# Altium footprint library smd-ipc.PCBLIB: 363 footprints (part 14 of 27)
Each footprint in its own frame and in the unit in brackets; x right, y up, seen from the top. Pads: shape width x height; smd on the part's side, far side on the other; paste and mask are expansions set on the pad; w line width, h text height; cw(c..) or ccw(c..) is an arc to the next point about the centre after c.
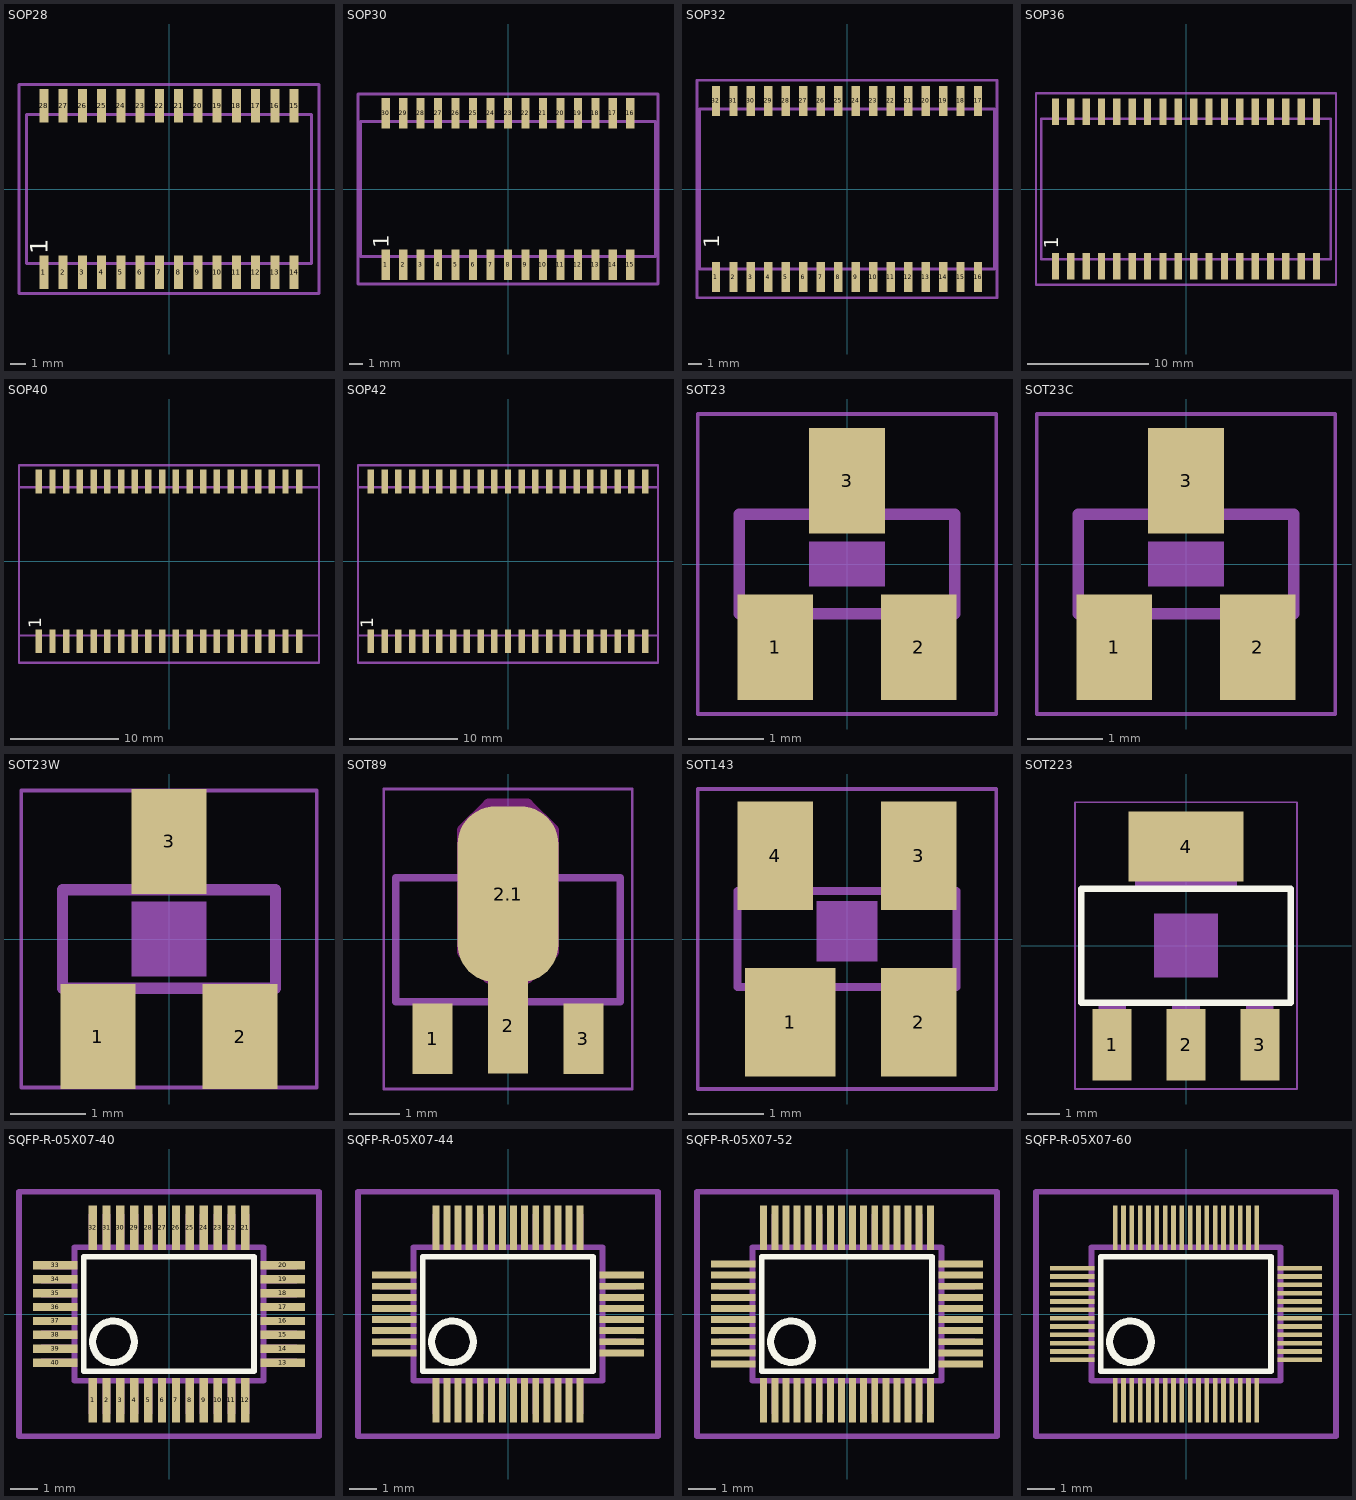
[diagram p13: the footprints below, top view; thin cyan lines are the x and y axes]

## SOP28 [mm]
pads (28):
  rect 0.6x2.2 smd: 1(-8.255,-5.5) 2(-6.985,-5.5) 3(-5.715,-5.5) 4(-4.445,-5.5) 5(-3.175,-5.5) 6(-1.905,-5.5) 7(-0.635,-5.5) 8(0.635,-5.5) 9(1.905,-5.5) 10(3.175,-5.5) 11(4.445,-5.5) 12(5.715,-5.5) 13(6.985,-5.5) 14(8.255,-5.5) 15(8.255,5.5) 16(6.985,5.5) 17(5.715,5.5) 18(4.445,5.5) 19(3.175,5.5) 20(1.905,5.5) 21(0.635,5.5) 22(-0.635,5.5) 23(-1.905,5.5) 24(-3.175,5.5) 25(-4.445,5.5) 26(-5.715,5.5) 27(-6.985,5.5) 28(-8.255,5.5)
Top Overlay:
  text "1" at -7.62,-4.31 h1.97
Mechanical 16:
  rectangle: -8.505,-6.34 -8.005,-5.01
  rectangle: -7.235,-6.34 -6.735,-5.01
  rectangle: -5.965,-6.34 -5.465,-5.01
  rectangle: -4.695,-6.34 -4.195,-5.01
  rectangle: -3.425,-6.34 -2.925,-5.01
  rectangle: -2.155,-6.34 -1.655,-5.01
  rectangle: -0.885,-6.34 -0.385,-5.01
  rectangle: 0.385,-6.34 0.885,-5.01
  rectangle: 1.655,-6.34 2.155,-5.01
  rectangle: 2.925,-6.34 3.425,-5.01
  rectangle: 4.195,-6.34 4.695,-5.01
  rectangle: 5.465,-6.34 5.965,-5.01
  rectangle: 6.735,-6.34 7.235,-5.01
  rectangle: 8.005,-6.34 8.505,-5.01
  rectangle: 8.005,5.01 8.505,6.34
  rectangle: 6.735,5.01 7.235,6.34
  rectangle: 5.465,5.01 5.965,6.34
  rectangle: 4.195,5.01 4.695,6.34
  rectangle: 2.925,5.01 3.425,6.34
  rectangle: 1.655,5.01 2.155,6.34
  rectangle: 0.385,5.01 0.885,6.34
  rectangle: -0.885,5.01 -0.385,6.34
  rectangle: -2.155,5.01 -1.655,6.34
  rectangle: -3.425,5.01 -2.925,6.34
  rectangle: -4.695,5.01 -4.195,6.34
  rectangle: -5.965,5.01 -5.465,6.34
  rectangle: -7.235,5.01 -6.735,6.34
  rectangle: -8.505,5.01 -8.005,6.34
  lines w0.203: -9.415,-4.91 9.415,-4.91 9.415,4.91 -9.415,4.91 -9.415,-4.91
Mechanical 27:
  lines w0.2: -9.9,-6.9 -9.9,6.9 9.9,6.9 9.9,-6.9 -9.9,-6.9

## SOP30 [mm]
pads (30):
  rect 0.6x2.2 smd: 1(-8.89,-5.5) 2(-7.62,-5.5) 3(-6.35,-5.5) 4(-5.08,-5.5) 5(-3.81,-5.5) 6(-2.54,-5.5) 7(-1.27,-5.5) 8(0,-5.5) 9(1.27,-5.5) 10(2.54,-5.5) 11(3.81,-5.5) 12(5.08,-5.5) 13(6.35,-5.5) 14(7.62,-5.5) 15(8.89,-5.5) 16(8.89,5.5) 17(7.62,5.5) 18(6.35,5.5) 19(5.08,5.5) 20(3.81,5.5) 21(2.54,5.5) 22(1.27,5.5) 23(0,5.5) 24(-1.27,5.5) 25(-2.54,5.5) 26(-3.81,5.5) 27(-5.08,5.5) 28(-6.35,5.5) 29(-7.62,5.5) 30(-8.89,5.5)
Top Overlay:
  text "1" at -8.255,-4.31 h1.97
Mechanical 16:
  rectangle: -9.14,-6.34 -8.64,-5.01
  rectangle: -7.87,-6.34 -7.37,-5.01
  rectangle: -6.6,-6.34 -6.1,-5.01
  rectangle: -5.33,-6.34 -4.83,-5.01
  rectangle: -4.06,-6.34 -3.56,-5.01
  rectangle: -2.79,-6.34 -2.29,-5.01
  rectangle: -1.52,-6.34 -1.02,-5.01
  rectangle: -0.25,-6.34 0.25,-5.01
  rectangle: 1.02,-6.34 1.52,-5.01
  rectangle: 2.29,-6.34 2.79,-5.01
  rectangle: 3.56,-6.34 4.06,-5.01
  rectangle: 4.83,-6.34 5.33,-5.01
  rectangle: 6.1,-6.34 6.6,-5.01
  rectangle: 7.37,-6.34 7.87,-5.01
  rectangle: 8.64,-6.34 9.14,-5.01
  rectangle: 8.64,5.01 9.14,6.34
  rectangle: 7.37,5.01 7.87,6.34
  rectangle: 6.1,5.01 6.6,6.34
  rectangle: 4.83,5.01 5.33,6.34
  rectangle: 3.56,5.01 4.06,6.34
  rectangle: 2.29,5.01 2.79,6.34
  rectangle: 1.02,5.01 1.52,6.34
  rectangle: -0.25,5.01 0.25,6.34
  rectangle: -1.52,5.01 -1.02,6.34
  rectangle: -2.79,5.01 -2.29,6.34
  rectangle: -4.06,5.01 -3.56,6.34
  rectangle: -5.33,5.01 -4.83,6.34
  rectangle: -6.6,5.01 -6.1,6.34
  rectangle: -7.87,5.01 -7.37,6.34
  rectangle: -9.14,5.01 -8.64,6.34
  lines w0.203: -10.7,-4.91 10.7,-4.91 10.7,4.91 -10.7,4.91 -10.7,-4.91
Mechanical 27:
  lines w0.2: -10.9,-6.9 -10.9,6.9 10.9,6.9 10.9,-6.9 -10.9,-6.9

## SOP32 [mm]
pads (32):
  rect 0.6x2.2 smd: 1(-9.525,-6.4) 2(-8.255,-6.4) 3(-6.985,-6.4) 4(-5.715,-6.4) 5(-4.445,-6.4) 6(-3.175,-6.4) 7(-1.905,-6.4) 8(-0.635,-6.4) 9(0.635,-6.4) 10(1.905,-6.4) 11(3.175,-6.4) 12(4.445,-6.4) 13(5.715,-6.4) 14(6.985,-6.4) 15(8.255,-6.4) 16(9.525,-6.4) 17(9.525,6.4) 18(8.255,6.4) 19(6.985,6.4) 20(5.715,6.4) 21(4.445,6.4) 22(3.175,6.4) 23(1.905,6.4) 24(0.635,6.4) 25(-0.635,6.4) 26(-1.905,6.4) 27(-3.175,6.4) 28(-4.445,6.4) 29(-5.715,6.4) 30(-6.985,6.4) 31(-8.255,6.4) 32(-9.525,6.4)
Top Overlay:
  text "1" at -8.89,-4.31 h1.97
Mechanical 16:
  rectangle: -9.775,-7.24 -9.275,-5.91
  rectangle: -8.505,-7.24 -8.005,-5.91
  rectangle: -7.235,-7.24 -6.735,-5.91
  rectangle: -5.965,-7.24 -5.465,-5.91
  rectangle: -4.695,-7.24 -4.195,-5.91
  rectangle: -3.425,-7.24 -2.925,-5.91
  rectangle: -2.155,-7.24 -1.655,-5.91
  rectangle: -0.885,-7.24 -0.385,-5.91
  rectangle: 0.385,-7.24 0.885,-5.91
  rectangle: 1.655,-7.24 2.155,-5.91
  rectangle: 2.925,-7.24 3.425,-5.91
  rectangle: 4.195,-7.24 4.695,-5.91
  rectangle: 5.465,-7.24 5.965,-5.91
  rectangle: 6.735,-7.24 7.235,-5.91
  rectangle: 8.005,-7.24 8.505,-5.91
  rectangle: 9.275,-7.24 9.775,-5.91
  rectangle: 9.275,5.91 9.775,7.24
  rectangle: 8.005,5.91 8.505,7.24
  rectangle: 6.735,5.91 7.235,7.24
  rectangle: 5.465,5.91 5.965,7.24
  rectangle: 4.195,5.91 4.695,7.24
  rectangle: 2.925,5.91 3.425,7.24
  rectangle: 1.655,5.91 2.155,7.24
  rectangle: 0.385,5.91 0.885,7.24
  rectangle: -0.885,5.91 -0.385,7.24
  rectangle: -2.155,5.91 -1.655,7.24
  rectangle: -3.425,5.91 -2.925,7.24
  rectangle: -4.695,5.91 -4.195,7.24
  rectangle: -5.965,5.91 -5.465,7.24
  rectangle: -7.235,5.91 -6.735,7.24
  rectangle: -8.505,5.91 -8.005,7.24
  rectangle: -9.775,5.91 -9.275,7.24
  lines w0.203: -10.7,-5.81 10.7,-5.81 10.7,5.81 -10.7,5.81 -10.7,-5.81
Mechanical 27:
  lines w0.2: -10.9,-7.9 -10.9,7.9 10.9,7.9 10.9,-7.9 -10.9,-7.9

## SOP36 [mm]
pads (36):
  rect 0.6x2.2 smd: 1(-10.795,-6.4) 2(-9.525,-6.4) 3(-8.255,-6.4) 4(-6.985,-6.4) 5(-5.715,-6.4) 6(-4.445,-6.4) 7(-3.175,-6.4) 8(-1.905,-6.4) 9(-0.635,-6.4) 10(0.635,-6.4) 11(1.905,-6.4) 12(3.175,-6.4) 13(4.445,-6.4) 14(5.715,-6.4) 15(6.985,-6.4) 16(8.255,-6.4) 17(9.525,-6.4) 18(10.795,-6.4) 19(10.795,6.4) 20(9.525,6.4) 21(8.255,6.4) 22(6.985,6.4) 23(5.715,6.4) 24(4.445,6.4) 25(3.175,6.4) 26(1.905,6.4) 27(0.635,6.4) 28(-0.635,6.4) 29(-1.905,6.4) 30(-3.175,6.4) 31(-4.445,6.4) 32(-5.715,6.4) 33(-6.985,6.4) 34(-8.255,6.4) 35(-9.525,6.4) 36(-10.795,6.4)
Top Overlay:
  text "1" at -10.16,-4.945 h1.97
Mechanical 16:
  rectangle: -11.045,-7.24 -10.545,-5.91
  rectangle: -9.775,-7.24 -9.275,-5.91
  rectangle: -8.505,-7.24 -8.005,-5.91
  rectangle: -7.235,-7.24 -6.735,-5.91
  rectangle: -5.965,-7.24 -5.465,-5.91
  rectangle: -4.695,-7.24 -4.195,-5.91
  rectangle: -3.425,-7.24 -2.925,-5.91
  rectangle: -2.155,-7.24 -1.655,-5.91
  rectangle: -0.885,-7.24 -0.385,-5.91
  rectangle: 0.385,-7.24 0.885,-5.91
  rectangle: 1.655,-7.24 2.155,-5.91
  rectangle: 2.925,-7.24 3.425,-5.91
  rectangle: 4.195,-7.24 4.695,-5.91
  rectangle: 5.465,-7.24 5.965,-5.91
  rectangle: 6.735,-7.24 7.235,-5.91
  rectangle: 8.005,-7.24 8.505,-5.91
  rectangle: 9.275,-7.24 9.775,-5.91
  rectangle: 10.545,-7.24 11.045,-5.91
  rectangle: 10.545,5.91 11.045,7.24
  rectangle: 9.275,5.91 9.775,7.24
  rectangle: 8.005,5.91 8.505,7.24
  rectangle: 6.735,5.91 7.235,7.24
  rectangle: 5.465,5.91 5.965,7.24
  rectangle: 4.195,5.91 4.695,7.24
  rectangle: 2.925,5.91 3.425,7.24
  rectangle: 1.655,5.91 2.155,7.24
  rectangle: 0.385,5.91 0.885,7.24
  rectangle: -0.885,5.91 -0.385,7.24
  rectangle: -2.155,5.91 -1.655,7.24
  rectangle: -3.425,5.91 -2.925,7.24
  rectangle: -4.695,5.91 -4.195,7.24
  rectangle: -5.965,5.91 -5.465,7.24
  rectangle: -7.235,5.91 -6.735,7.24
  rectangle: -8.505,5.91 -8.005,7.24
  rectangle: -9.775,5.91 -9.275,7.24
  rectangle: -11.045,5.91 -10.545,7.24
  lines w0.203: -11.97,-5.81 11.97,-5.81 11.97,5.81 -11.97,5.81 -11.97,-5.81
Mechanical 27:
  lines w0.2: -12.4,-7.9 -12.4,7.9 12.4,7.9 12.4,-7.9 -12.4,-7.9

## SOP40 [mm]
pads (40):
  rect 0.6x2.2 smd: 1(-12.065,-7.4) 2(-10.795,-7.4) 3(-9.525,-7.4) 4(-8.255,-7.4) 5(-6.985,-7.4) 6(-5.715,-7.4) 7(-4.445,-7.4) 8(-3.175,-7.4) 9(-1.905,-7.4) 10(-0.635,-7.4) 11(0.635,-7.4) 12(1.905,-7.4) 13(3.175,-7.4) 14(4.445,-7.4) 15(5.715,-7.4) 16(6.985,-7.4) 17(8.255,-7.4) 18(9.525,-7.4) 19(10.795,-7.4) 20(12.065,-7.4) 21(12.065,7.4) 22(10.795,7.4) 23(9.525,7.4) 24(8.255,7.4) 25(6.985,7.4) 26(5.715,7.4) 27(4.445,7.4) 28(3.175,7.4) 29(1.905,7.4) 30(0.635,7.4) 31(-0.635,7.4) 32(-1.905,7.4) 33(-3.175,7.4) 34(-4.445,7.4) 35(-5.715,7.4) 36(-6.985,7.4) 37(-8.255,7.4) 38(-9.525,7.4) 39(-10.795,7.4) 40(-12.065,7.4)
Top Overlay:
  text "1" at -11.43,-6.215 h1.97
Mechanical 16:
  rectangle: -12.31,-8.25 -11.82,-6.97
  rectangle: -11.04,-8.25 -10.55,-6.97
  rectangle: -9.77,-8.25 -9.28,-6.97
  rectangle: -8.5,-8.25 -8.01,-6.97
  rectangle: -7.23,-8.25 -6.74,-6.97
  rectangle: -5.96,-8.25 -5.47,-6.97
  rectangle: -4.69,-8.25 -4.2,-6.97
  rectangle: -3.42,-8.25 -2.93,-6.97
  rectangle: -2.15,-8.25 -1.66,-6.97
  rectangle: -0.88,-8.25 -0.39,-6.97
  rectangle: 0.39,-8.25 0.88,-6.97
  rectangle: 1.66,-8.25 2.15,-6.97
  rectangle: 2.93,-8.25 3.42,-6.97
  rectangle: 4.2,-8.25 4.69,-6.97
  rectangle: 5.47,-8.25 5.96,-6.97
  rectangle: 6.74,-8.25 7.23,-6.97
  rectangle: 8.01,-8.25 8.5,-6.97
  rectangle: 9.28,-8.25 9.77,-6.97
  rectangle: 10.55,-8.25 11.04,-6.97
  rectangle: 11.82,-8.25 12.31,-6.97
  rectangle: 11.82,6.97 12.31,8.25
  rectangle: 10.55,6.97 11.04,8.25
  rectangle: 9.28,6.97 9.77,8.25
  rectangle: 8.01,6.97 8.5,8.25
  rectangle: 6.74,6.97 7.23,8.25
  rectangle: 5.47,6.97 5.96,8.25
  rectangle: 4.2,6.97 4.69,8.25
  rectangle: 2.93,6.97 3.42,8.25
  rectangle: 1.66,6.97 2.15,8.25
  rectangle: 0.39,6.97 0.88,8.25
  rectangle: -0.88,6.97 -0.39,8.25
  rectangle: -2.15,6.97 -1.66,8.25
  rectangle: -3.42,6.97 -2.93,8.25
  rectangle: -4.69,6.97 -4.2,8.25
  rectangle: -5.96,6.97 -5.47,8.25
  rectangle: -7.23,6.97 -6.74,8.25
  rectangle: -8.5,6.97 -8.01,8.25
  rectangle: -9.77,6.97 -9.28,8.25
  rectangle: -11.04,6.97 -10.55,8.25
  rectangle: -12.31,6.97 -11.82,8.25
  lines w0.203: -13.9,-6.87 13.9,-6.87 13.9,6.87 -13.9,6.87 -13.9,-6.87
Mechanical 27:
  lines w0.2: -13.9,-9.4 -13.9,8.9 13.9,8.9 13.9,-9.4 -13.9,-9.4

## SOP42 [mm]
pads (42):
  rect 0.6x2.2 smd: 1(-12.7,-7.4) 2(-11.43,-7.4) 3(-10.16,-7.4) 4(-8.89,-7.4) 5(-7.62,-7.4) 6(-6.35,-7.4) 7(-5.08,-7.4) 8(-3.81,-7.4) 9(-2.54,-7.4) 10(-1.27,-7.4) 11(0,-7.4) 12(1.27,-7.4) 13(2.54,-7.4) 14(3.81,-7.4) 15(5.08,-7.4) 16(6.35,-7.4) 17(7.62,-7.4) 18(8.89,-7.4) 19(10.16,-7.4) 20(11.43,-7.4) 21(12.7,-7.4) 22(12.7,7.4) 23(11.43,7.4) 24(10.16,7.4) 25(8.89,7.4) 26(7.62,7.4) 27(6.35,7.4) 28(5.08,7.4) 29(3.81,7.4) 30(2.54,7.4) 31(1.27,7.4) 32(0,7.4) 33(-1.27,7.4) 34(-2.54,7.4) 35(-3.81,7.4) 36(-5.08,7.4) 37(-6.35,7.4) 38(-7.62,7.4) 39(-8.89,7.4) 40(-10.16,7.4) 41(-11.43,7.4) 42(-12.7,7.4)
Top Overlay:
  text "1" at -12.065,-6.215 h1.97
Mechanical 16:
  rectangle: -12.945,-8.25 -12.455,-6.97
  rectangle: -11.675,-8.25 -11.185,-6.97
  rectangle: -10.405,-8.25 -9.915,-6.97
  rectangle: -9.135,-8.25 -8.645,-6.97
  rectangle: -7.865,-8.25 -7.375,-6.97
  rectangle: -6.595,-8.25 -6.105,-6.97
  rectangle: -5.325,-8.25 -4.835,-6.97
  rectangle: -4.055,-8.25 -3.565,-6.97
  rectangle: -2.785,-8.25 -2.295,-6.97
  rectangle: -1.515,-8.25 -1.025,-6.97
  rectangle: -0.245,-8.25 0.245,-6.97
  rectangle: 1.025,-8.25 1.515,-6.97
  rectangle: 2.295,-8.25 2.785,-6.97
  rectangle: 3.565,-8.25 4.055,-6.97
  rectangle: 4.835,-8.25 5.325,-6.97
  rectangle: 6.105,-8.25 6.595,-6.97
  rectangle: 7.375,-8.25 7.865,-6.97
  rectangle: 8.645,-8.25 9.135,-6.97
  rectangle: 9.915,-8.25 10.405,-6.97
  rectangle: 11.185,-8.25 11.675,-6.97
  rectangle: 12.455,-8.25 12.945,-6.97
  rectangle: 12.455,6.97 12.945,8.25
  rectangle: 11.185,6.97 11.675,8.25
  rectangle: 9.915,6.97 10.405,8.25
  rectangle: 8.645,6.97 9.135,8.25
  rectangle: 7.375,6.97 7.865,8.25
  rectangle: 6.105,6.97 6.595,8.25
  rectangle: 4.835,6.97 5.325,8.25
  rectangle: 3.565,6.97 4.055,8.25
  rectangle: 2.295,6.97 2.785,8.25
  rectangle: 1.025,6.97 1.515,8.25
  rectangle: -0.245,6.97 0.245,8.25
  rectangle: -1.515,6.97 -1.025,8.25
  rectangle: -2.785,6.97 -2.295,8.25
  rectangle: -4.055,6.97 -3.565,8.25
  rectangle: -5.325,6.97 -4.835,8.25
  rectangle: -6.595,6.97 -6.105,8.25
  rectangle: -7.865,6.97 -7.375,8.25
  rectangle: -9.135,6.97 -8.645,8.25
  rectangle: -10.405,6.97 -9.915,8.25
  rectangle: -11.675,6.97 -11.185,8.25
  rectangle: -12.945,6.97 -12.455,8.25
  lines w0.203: -13.9,-6.87 13.9,-6.87 13.9,6.87 -13.9,6.87 -13.9,-6.87
Mechanical 27:
  lines w0.2: -13.9,-9.4 -13.9,8.9 13.9,8.9 13.9,-9.4 -13.9,-9.4

## SOT23 [mm]
pads (3):
  rect 1x1.4 smd: 1(-0.95,-1.1) 2(0.95,-1.1) 3(0,1.1)
Mechanical 6:
  rectangle: -0.5,-0.3 0.5,0.3
Mechanical 16:
  rectangle: -0.229,0.711 0.229,1.295
  rectangle: 0.711,-1.295 1.168,-0.711
  rectangle: -1.168,-1.295 -0.711,-0.711
  lines w0.152: -1.422,-0.66 1.422,-0.66 1.422,0.66 -1.422,0.66 -1.422,-0.66
Mechanical 27:
  lines w0.051: -1.973,-1.983 1.973,-1.983 1.973,1.983 -1.973,1.983 -1.973,-1.983

## SOT23C [mm]
pads (3):
  rect 1x1.4 smd: 1(-0.95,-1.1) 2(0.95,-1.1) 3(0,1.1)
Mechanical 6:
  rectangle: -0.5,-0.3 0.5,0.3
Mechanical 16:
  rectangle: -0.229,0.711 0.229,1.295
  rectangle: 0.711,-1.295 1.168,-0.711
  rectangle: -1.168,-1.295 -0.711,-0.711
  lines w0.152: -1.422,-0.66 1.422,-0.66 1.422,0.66 -1.422,0.66 -1.422,-0.66
Mechanical 27:
  lines w0.051: -1.973,-1.983 1.973,-1.983 1.973,1.983 -1.973,1.983 -1.973,-1.983

## SOT23W [mm]
pads (3):
  rect 1x1.4 smd: 1(-0.95,-1.303) 2(0.95,-1.303) 3(0,1.303)
Mechanical 6:
  rectangle: -0.5,-0.5 0.5,0.5
Mechanical 16:
  rectangle: -0.229,0.711 0.229,1.295
  rectangle: 0.711,-1.295 1.168,-0.711
  rectangle: -1.168,-1.295 -0.711,-0.711
  lines w0.152: -1.422,-0.66 1.422,-0.66 1.422,0.66 -1.422,0.66 -1.422,-0.66
Mechanical 27:
  lines w0.051: -1.973,-1.983 1.973,-1.983 1.973,1.983 -1.973,1.983 -1.973,-1.983

## SOT89 [mil]
pads (4):
  rect 31.5x55.12 smd: 1(-59.02,-77.99) 3(59.02,-77.99)
  rect 31.5x74.8 smd: 2(0,-67.99)
  rrect75% 78.74x137.8 smd: 2.1(0,35)
Top Layer keep-out:
  lines w10: -10,-45 -10,-30 -15,-30 -35,-10 -35,85 -15,105 15,105 35,85 35,-10 15,-30 10,-30 10,-45
  lines w30: 0,-30 0,0
  lines w66: 0,0 0,70
Top Paste:
  rectangle: -15,-105 15,-52.5
  lines w70.87: 0,7.5 0,65
Top Solder:
  rectangle: -20,-110 20,-50
Mechanical 16:
  rectangle: -68,-83 -50,-50
  rectangle: 50,-83 68,-50
  rectangle: -11,-83 11,-50
  region: 0,0 10,0 10,10 0,10
  lines w6: -87.99,-49.02 87.99,-49.02 87.99,47.99 -87.99,47.99 -87.99,-49.02
  lines w8: -31,51 31,51 31,62 14,79 -14,79 -31,62 -31,51
Via Holes:
  lines w10: -10,-45 -10,-30 -15,-30 -35,-10 -35,85 -15,105 15,105 35,85 35,-10 15,-30 10,-30 10,-45 ; 0,-45 0,-30
  lines w30: 0,-30 0,0
  lines w66: 0,0 0,70
Mechanical 27:
  lines w2: -97.36,-117.44 97.36,-117.44 97.36,117.44 -97.36,117.44 -97.36,-117.44

## SOT143 [mm]
pads (4):
  rect 1.2x1.44 smd: 1(-0.75,-1.1)
  rect 1x1.44 smd: 2(0.95,-1.1) 3(0.95,1.1) 4(-0.95,1.1)
Mechanical 6:
  rectangle: -0.4,-0.3 0.4,0.5
Mechanical 16:
  rectangle: 0.737,-1.321 1.194,-0.635
  rectangle: 0.711,0.635 1.168,1.321
  rectangle: -1.143,0.635 -0.686,1.321
  rectangle: -1.194,-1.321 -0.305,-0.635
  lines w0.102: -1.448,-0.635 1.448,-0.635 1.448,0.635 -1.448,0.635 -1.448,-0.635
Mechanical 27:
  lines w0.051: -1.973,-1.983 1.973,-1.983 1.973,1.983 -1.973,1.983 -1.973,-1.983

## SOT223 [mm]
pads (4):
  rect 1.219x2.235 smd: 1(-2.311,-3.099) 2(0,-3.099) 3(2.311,-3.099)
  rect 3.6x2.2 smd: 4(0,3.099)
Top Overlay:
  lines w0.203: -3.277,-1.778 3.277,-1.778 3.277,1.778 -3.277,1.778 -3.277,-1.778
Mechanical 6:
  rectangle: -1,-1 1,1
Mechanical 16:
  rectangle: -1.6,1.803 1.6,3.658
  rectangle: -0.432,-3.658 0.432,-1.803
  rectangle: -2.743,-3.658 -1.88,-1.803
  rectangle: 1.88,-3.658 2.743,-1.803
  rectangle: -1.6,1.803 1.6,3.658
  rectangle: -0.432,-3.658 0.432,-1.803
  rectangle: -2.743,-3.658 -1.88,-1.803
  rectangle: 1.88,-3.658 2.743,-1.803
Mechanical 27:
  lines w0.051: -3.473,-4.483 3.473,-4.483 3.473,4.483 -3.473,4.483 -3.473,-4.483

## SQFP-R-05X07-40 [mm]
pads (40):
  rect 0.3x1.6 smd: 1(-2.75,-3.1) 2(-2.25,-3.1) 3(-1.75,-3.1) 4(-1.25,-3.1) 5(-0.75,-3.1) 6(-0.25,-3.1) 7(0.25,-3.1) 8(0.75,-3.1) 9(1.25,-3.1) 10(1.75,-3.1) 11(2.25,-3.1) 12(2.75,-3.1) 21(2.75,3.1) 22(2.25,3.1) 23(1.75,3.1) 24(1.25,3.1) 25(0.75,3.1) 26(0.25,3.1) 27(-0.25,3.1) 28(-0.75,3.1) 29(-1.25,3.1) 30(-1.75,3.1) 31(-2.25,3.1) 32(-2.75,3.1)
  rect 1.6x0.3 smd: 13(4.1,-1.75) 14(4.1,-1.25) 15(4.1,-0.75) 16(4.1,-0.25) 17(4.1,0.25) 18(4.1,0.75) 19(4.1,1.25) 20(4.1,1.75) 33(-4.1,1.75) 34(-4.1,1.25) 35(-4.1,0.75) 36(-4.1,0.25) 37(-4.1,-0.25) 38(-4.1,-0.75) 39(-4.1,-1.25) 40(-4.1,-1.75)
Top Overlay:
  circle w0.254: c-2,-1 r0.75
  lines w0.203: -3.07,-2.06 3.06,-2.06 3.06,2.06 -3.07,2.06 -3.07,-2.06
Mechanical 16:
  rectangle: -2.9,-3.6 -2.6,-2.45
  rectangle: 3.4,-1.9 4.6,-1.6
  rectangle: -2.4,-3.6 -2.1,-2.45
  rectangle: -1.9,-3.6 -1.6,-2.45
  rectangle: -1.4,-3.6 -1.1,-2.45
  rectangle: -0.9,-3.6 -0.6,-2.45
  rectangle: -0.4,-3.6 -0.1,-2.45
  rectangle: 0.1,-3.6 0.4,-2.45
  rectangle: 0.6,-3.6 0.9,-2.45
  rectangle: 1.1,-3.6 1.4,-2.45
  rectangle: 1.6,-3.6 1.9,-2.45
  rectangle: 2.1,-3.6 2.4,-2.45
  rectangle: 2.6,-3.6 2.9,-2.45
  rectangle: 3.4,-1.4 4.6,-1.1
  rectangle: 3.4,-0.9 4.6,-0.6
  rectangle: 3.4,-0.4 4.6,-0.1
  rectangle: 3.4,0.1 4.6,0.4
  rectangle: 3.4,0.6 4.6,0.9
  rectangle: 3.4,1.1 4.6,1.4
  rectangle: 3.4,1.6 4.6,1.9
  rectangle: 2.6,2.45 2.9,3.6
  rectangle: 2.1,2.45 2.4,3.6
  rectangle: 1.6,2.45 1.9,3.6
  rectangle: 1.1,2.45 1.4,3.6
  rectangle: 0.6,2.45 0.9,3.6
  rectangle: 0.1,2.45 0.4,3.6
  rectangle: -0.4,2.45 -0.1,3.6
  rectangle: -0.9,2.45 -0.6,3.6
  rectangle: -1.4,2.45 -1.1,3.6
  rectangle: -1.9,2.45 -1.6,3.6
  rectangle: -2.4,2.45 -2.1,3.6
  rectangle: -2.9,2.45 -2.6,3.6
  rectangle: -4.6,1.6 -3.4,1.9
  rectangle: -4.6,1.1 -3.4,1.4
  rectangle: -4.6,0.6 -3.4,0.9
  rectangle: -4.6,0.1 -3.4,0.4
  rectangle: -4.6,-0.4 -3.4,-0.1
  rectangle: -4.6,-0.9 -3.4,-0.6
  rectangle: -4.6,-1.4 -3.4,-1.1
  rectangle: -4.6,-1.9 -3.4,-1.6
  lines w0.203: -3.4,-2.4 3.4,-2.4 3.4,2.4 -3.4,2.4 -3.4,-2.4
Mechanical 27:
  lines w0.2: -5.4,-4.4 -5.4,4.4 5.4,4.4 5.4,-4.4 -5.4,-4.4

## SQFP-R-05X07-44 [mm]
pads (44):
  rect 0.25x1.6 smd: 1(-2.6,-3.1) 2(-2.2,-3.1) 3(-1.8,-3.1) 4(-1.4,-3.1) 5(-1,-3.1) 6(-0.6,-3.1) 7(-0.2,-3.1) 8(0.2,-3.1) 9(0.6,-3.1) 10(1,-3.1) 11(1.4,-3.1) 12(1.8,-3.1) 13(2.2,-3.1) 14(2.6,-3.1) 23(2.6,3.1) 24(2.2,3.1) 25(1.8,3.1) 26(1.4,3.1) 27(1,3.1) 28(0.6,3.1) 29(0.2,3.1) 30(-0.2,3.1) 31(-0.6,3.1) 32(-1,3.1) 33(-1.4,3.1) 34(-1.8,3.1) 35(-2.2,3.1) 36(-2.6,3.1)
  rect 1.6x0.25 smd: 15(4.1,-1.4) 16(4.1,-1) 17(4.1,-0.6) 18(4.1,-0.2) 19(4.1,0.2) 20(4.1,0.6) 21(4.1,1) 22(4.1,1.4) 37(-4.1,1.4) 38(-4.1,1) 39(-4.1,0.6) 40(-4.1,0.2) 41(-4.1,-0.2) 42(-4.1,-0.6) 43(-4.1,-1) 44(-4.1,-1.4)
Top Overlay:
  circle w0.254: c-2,-1 r0.75
  lines w0.203: -3.07,-2.06 3.06,-2.06 3.06,2.06 -3.07,2.06 -3.07,-2.06
Mechanical 16:
  rectangle: -2.71,-3.6 -2.49,-2.45
  rectangle: 3.45,-1.51 4.6,-1.29
  rectangle: -2.31,-3.6 -2.09,-2.45
  rectangle: -1.91,-3.6 -1.69,-2.45
  rectangle: -1.51,-3.6 -1.29,-2.45
  rectangle: -1.11,-3.6 -0.89,-2.45
  rectangle: -0.71,-3.6 -0.49,-2.45
  rectangle: -0.31,-3.6 -0.09,-2.45
  rectangle: 0.09,-3.6 0.31,-2.45
  rectangle: 0.49,-3.6 0.71,-2.45
  rectangle: 0.89,-3.6 1.11,-2.45
  rectangle: 1.29,-3.6 1.51,-2.45
  rectangle: 1.69,-3.6 1.91,-2.45
  rectangle: 2.09,-3.6 2.31,-2.45
  rectangle: 2.49,-3.6 2.71,-2.45
  rectangle: 3.45,-1.11 4.6,-0.89
  rectangle: 3.45,-0.71 4.6,-0.49
  rectangle: 3.45,-0.31 4.6,-0.09
  rectangle: 3.45,0.09 4.6,0.31
  rectangle: 3.45,0.49 4.6,0.71
  rectangle: 3.45,0.89 4.6,1.11
  rectangle: 3.45,1.29 4.6,1.51
  rectangle: 2.49,2.45 2.71,3.6
  rectangle: 2.09,2.45 2.31,3.6
  rectangle: 1.69,2.45 1.91,3.6
  rectangle: 1.29,2.45 1.51,3.6
  rectangle: 0.89,2.45 1.11,3.6
  rectangle: 0.49,2.45 0.71,3.6
  rectangle: 0.09,2.45 0.31,3.6
  rectangle: -0.31,2.45 -0.09,3.6
  rectangle: -0.71,2.45 -0.49,3.6
  rectangle: -1.11,2.45 -0.89,3.6
  rectangle: -1.51,2.45 -1.29,3.6
  rectangle: -1.91,2.45 -1.69,3.6
  rectangle: -2.31,2.45 -2.09,3.6
  rectangle: -2.71,2.45 -2.49,3.6
  rectangle: -4.6,1.29 -3.45,1.51
  rectangle: -4.6,0.89 -3.45,1.11
  rectangle: -4.6,0.49 -3.45,0.71
  rectangle: -4.6,0.09 -3.45,0.31
  rectangle: -4.6,-0.31 -3.45,-0.09
  rectangle: -4.6,-0.71 -3.45,-0.49
  rectangle: -4.6,-1.11 -3.45,-0.89
  rectangle: -4.6,-1.51 -3.45,-1.29
  lines w0.203: -3.4,-2.4 3.4,-2.4 3.4,2.4 -3.4,2.4 -3.4,-2.4
Mechanical 27:
  lines w0.2: -5.4,-4.4 -5.4,4.4 5.4,4.4 5.4,-4.4 -5.4,-4.4

## SQFP-R-05X07-52 [mm]
pads (52):
  rect 0.25x1.6 smd: 1(-3,-3.1) 2(-2.6,-3.1) 3(-2.2,-3.1) 4(-1.8,-3.1) 5(-1.4,-3.1) 6(-1,-3.1) 7(-0.6,-3.1) 8(-0.2,-3.1) 9(0.2,-3.1) 10(0.6,-3.1) 11(1,-3.1) 12(1.4,-3.1) 13(1.8,-3.1) 14(2.2,-3.1) 15(2.6,-3.1) 16(3,-3.1) 27(3,3.1) 28(2.6,3.1) 29(2.2,3.1) 30(1.8,3.1) 31(1.4,3.1) 32(1,3.1) 33(0.6,3.1) 34(0.2,3.1) 35(-0.2,3.1) 36(-0.6,3.1) 37(-1,3.1) 38(-1.4,3.1) 39(-1.8,3.1) 40(-2.2,3.1) 41(-2.6,3.1) 42(-3,3.1)
  rect 1.6x0.25 smd: 17(4.1,-1.8) 18(4.1,-1.4) 19(4.1,-1) 20(4.1,-0.6) 21(4.1,-0.2) 22(4.1,0.2) 23(4.1,0.6) 24(4.1,1) 25(4.1,1.4) 26(4.1,1.8) 43(-4.1,1.8) 44(-4.1,1.4) 45(-4.1,1) 46(-4.1,0.6) 47(-4.1,0.2) 48(-4.1,-0.2) 49(-4.1,-0.6) 50(-4.1,-1) 51(-4.1,-1.4) 52(-4.1,-1.8)
Top Overlay:
  circle w0.254: c-2,-1 r0.75
  lines w0.203: -3.07,-2.06 3.06,-2.06 3.06,2.06 -3.07,2.06 -3.07,-2.06
Mechanical 16:
  rectangle: -3.11,-3.6 -2.89,-2.45
  rectangle: 3.45,-1.91 4.6,-1.69
  rectangle: -2.71,-3.6 -2.49,-2.45
  rectangle: -2.31,-3.6 -2.09,-2.45
  rectangle: -1.91,-3.6 -1.69,-2.45
  rectangle: -1.51,-3.6 -1.29,-2.45
  rectangle: -1.11,-3.6 -0.89,-2.45
  rectangle: -0.71,-3.6 -0.49,-2.45
  rectangle: -0.31,-3.6 -0.09,-2.45
  rectangle: 0.09,-3.6 0.31,-2.45
  rectangle: 0.49,-3.6 0.71,-2.45
  rectangle: 0.89,-3.6 1.11,-2.45
  rectangle: 1.29,-3.6 1.51,-2.45
  rectangle: 1.69,-3.6 1.91,-2.45
  rectangle: 2.09,-3.6 2.31,-2.45
  rectangle: 2.49,-3.6 2.71,-2.45
  rectangle: 2.89,-3.6 3.11,-2.45
  rectangle: 3.45,-1.51 4.6,-1.29
  rectangle: 3.45,-1.11 4.6,-0.89
  rectangle: 3.45,-0.71 4.6,-0.49
  rectangle: 3.45,-0.31 4.6,-0.09
  rectangle: 3.45,0.09 4.6,0.31
  rectangle: 3.45,0.49 4.6,0.71
  rectangle: 3.45,0.89 4.6,1.11
  rectangle: 3.45,1.29 4.6,1.51
  rectangle: 3.45,1.69 4.6,1.91
  rectangle: 2.89,2.45 3.11,3.6
  rectangle: 2.49,2.45 2.71,3.6
  rectangle: 2.09,2.45 2.31,3.6
  rectangle: 1.69,2.45 1.91,3.6
  rectangle: 1.29,2.45 1.51,3.6
  rectangle: 0.89,2.45 1.11,3.6
  rectangle: 0.49,2.45 0.71,3.6
  rectangle: 0.09,2.45 0.31,3.6
  rectangle: -0.31,2.45 -0.09,3.6
  rectangle: -0.71,2.45 -0.49,3.6
  rectangle: -1.11,2.45 -0.89,3.6
  rectangle: -1.51,2.45 -1.29,3.6
  rectangle: -1.91,2.45 -1.69,3.6
  rectangle: -2.31,2.45 -2.09,3.6
  rectangle: -2.71,2.45 -2.49,3.6
  rectangle: -3.11,2.45 -2.89,3.6
  rectangle: -4.6,1.69 -3.45,1.91
  rectangle: -4.6,1.29 -3.45,1.51
  rectangle: -4.6,0.89 -3.45,1.11
  rectangle: -4.6,0.49 -3.45,0.71
  rectangle: -4.6,0.09 -3.45,0.31
  rectangle: -4.6,-0.31 -3.45,-0.09
  rectangle: -4.6,-0.71 -3.45,-0.49
  rectangle: -4.6,-1.11 -3.45,-0.89
  rectangle: -4.6,-1.51 -3.45,-1.29
  rectangle: -4.6,-1.91 -3.45,-1.69
  lines w0.203: -3.4,-2.4 3.4,-2.4 3.4,2.4 -3.4,2.4 -3.4,-2.4
Mechanical 27:
  lines w0.2: -5.4,-4.4 -5.4,4.4 5.4,4.4 5.4,-4.4 -5.4,-4.4

## SQFP-R-05X07-60 [mm]
pads (60):
  rect 0.17x1.6 smd: 1(-2.55,-3.1) 2(-2.25,-3.1) 3(-1.95,-3.1) 4(-1.65,-3.1) 5(-1.35,-3.1) 6(-1.05,-3.1) 7(-0.75,-3.1) 8(-0.45,-3.1) 9(-0.15,-3.1) 10(0.15,-3.1) 11(0.45,-3.1) 12(0.75,-3.1) 13(1.05,-3.1) 14(1.35,-3.1) 15(1.65,-3.1) 16(1.95,-3.1) 17(2.25,-3.1) 18(2.55,-3.1) 31(2.55,3.1) 32(2.25,3.1) 33(1.95,3.1) 34(1.65,3.1) 35(1.35,3.1) 36(1.05,3.1) 37(0.75,3.1) 38(0.45,3.1) 39(0.15,3.1) 40(-0.15,3.1) 41(-0.45,3.1) 42(-0.75,3.1) 43(-1.05,3.1) 44(-1.35,3.1) 45(-1.65,3.1) 46(-1.95,3.1) 47(-2.25,3.1) 48(-2.55,3.1)
  rect 1.6x0.17 smd: 19(4.1,-1.65) 20(4.1,-1.35) 21(4.1,-1.05) 22(4.1,-0.75) 23(4.1,-0.45) 24(4.1,-0.15) 25(4.1,0.15) 26(4.1,0.45) 27(4.1,0.75) 28(4.1,1.05) 29(4.1,1.35) 30(4.1,1.65) 49(-4.1,1.65) 50(-4.1,1.35) 51(-4.1,1.05) 52(-4.1,0.75) 53(-4.1,0.45) 54(-4.1,0.15) 55(-4.1,-0.15) 56(-4.1,-0.45) 57(-4.1,-0.75) 58(-4.1,-1.05) 59(-4.1,-1.35) 60(-4.1,-1.65)
Top Overlay:
  circle w0.254: c-2,-1 r0.75
  lines w0.203: -3.07,-2.06 3.06,-2.06 3.06,2.06 -3.07,2.06 -3.07,-2.06
Mechanical 16:
  rectangle: -2.62,-3.6 -2.48,-2.45
  rectangle: 3.45,-1.72 4.6,-1.58
  rectangle: -2.32,-3.6 -2.18,-2.45
  rectangle: -2.02,-3.6 -1.88,-2.45
  rectangle: -1.72,-3.6 -1.58,-2.45
  rectangle: -1.42,-3.6 -1.28,-2.45
  rectangle: -1.12,-3.6 -0.98,-2.45
  rectangle: -0.82,-3.6 -0.68,-2.45
  rectangle: -0.52,-3.6 -0.38,-2.45
  rectangle: -0.22,-3.6 -0.08,-2.45
  rectangle: 0.08,-3.6 0.22,-2.45
  rectangle: 0.38,-3.6 0.52,-2.45
  rectangle: 0.68,-3.6 0.82,-2.45
  rectangle: 0.98,-3.6 1.12,-2.45
  rectangle: 1.28,-3.6 1.42,-2.45
  rectangle: 1.58,-3.6 1.72,-2.45
  rectangle: 1.88,-3.6 2.02,-2.45
  rectangle: 2.18,-3.6 2.32,-2.45
  rectangle: 2.48,-3.6 2.62,-2.45
  rectangle: 3.45,-1.42 4.6,-1.28
  rectangle: 3.45,-1.12 4.6,-0.98
  rectangle: 3.45,-0.82 4.6,-0.68
  rectangle: 3.45,-0.52 4.6,-0.38
  rectangle: 3.45,-0.22 4.6,-0.08
  rectangle: 3.45,0.08 4.6,0.22
  rectangle: 3.45,0.38 4.6,0.52
  rectangle: 3.45,0.68 4.6,0.82
  rectangle: 3.45,0.98 4.6,1.12
  rectangle: 3.45,1.28 4.6,1.42
  rectangle: 3.45,1.58 4.6,1.72
  rectangle: 2.48,2.45 2.62,3.6
  rectangle: 2.18,2.45 2.32,3.6
  rectangle: 1.88,2.45 2.02,3.6
  rectangle: 1.58,2.45 1.72,3.6
  rectangle: 1.28,2.45 1.42,3.6
  rectangle: 0.98,2.45 1.12,3.6
  rectangle: 0.68,2.45 0.82,3.6
  rectangle: 0.38,2.45 0.52,3.6
  rectangle: 0.08,2.45 0.22,3.6
  rectangle: -0.22,2.45 -0.08,3.6
  rectangle: -0.52,2.45 -0.38,3.6
  rectangle: -0.82,2.45 -0.68,3.6
  rectangle: -1.12,2.45 -0.98,3.6
  rectangle: -1.42,2.45 -1.28,3.6
  rectangle: -1.72,2.45 -1.58,3.6
  rectangle: -2.02,2.45 -1.88,3.6
  rectangle: -2.32,2.45 -2.18,3.6
  rectangle: -2.62,2.45 -2.48,3.6
  rectangle: -4.6,1.58 -3.45,1.72
  rectangle: -4.6,1.28 -3.45,1.42
  rectangle: -4.6,0.98 -3.45,1.12
  rectangle: -4.6,0.68 -3.45,0.82
  rectangle: -4.6,0.38 -3.45,0.52
  rectangle: -4.6,0.08 -3.45,0.22
  rectangle: -4.6,-0.22 -3.45,-0.08
  rectangle: -4.6,-0.52 -3.45,-0.38
  rectangle: -4.6,-0.82 -3.45,-0.68
  rectangle: -4.6,-1.12 -3.45,-0.98
  rectangle: -4.6,-1.42 -3.45,-1.28
  rectangle: -4.6,-1.72 -3.45,-1.58
  lines w0.203: -3.4,-2.4 3.4,-2.4 3.4,2.4 -3.4,2.4 -3.4,-2.4
Mechanical 27:
  lines w0.2: -5.4,-4.4 -5.4,4.4 5.4,4.4 5.4,-4.4 -5.4,-4.4